# Altium footprint library 20.Optical.PcbLib: 40 footprints (part 1 of 3)
Each footprint in its own frame and in the unit in brackets; x right, y up, seen from the top. Pads: shape width x height; smd on the part's side, far side on the other; paste and mask are expansions set on the pad; w line width, h text height; cw(c..) or ccw(c..) is an arc to the next point about the centre after c.
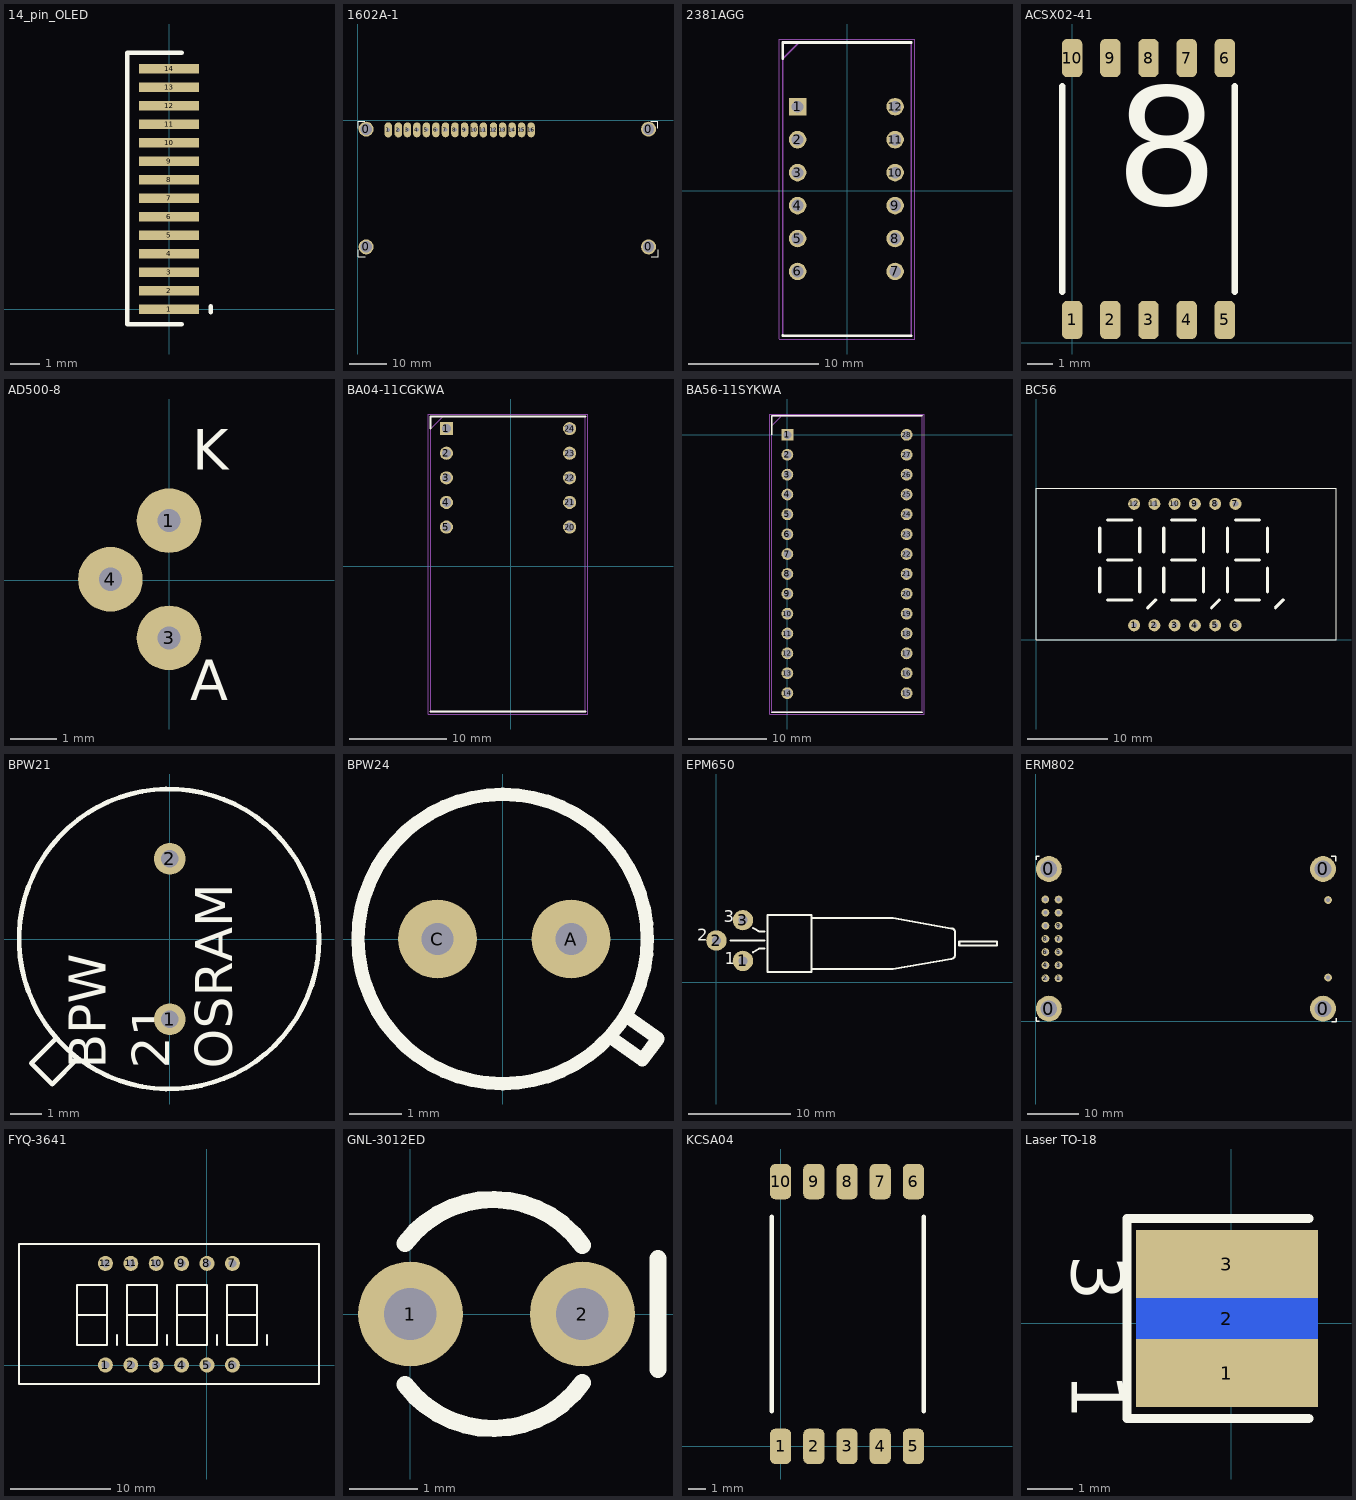
[diagram p0: the footprints below, top view; thin cyan lines are the x and y axes]

## 14_pin_OLED [mm]
pads (14):
  rect 2x0.32 smd: 1(0,0) 2(0,0.62) 3(0,1.24) 4(0,1.86) 5(0,2.48) 6(0,3.1) 7(0,3.72) 8(0,4.34) 9(0,4.96) 10(0,5.58) 11(0,6.2) 12(0,6.82) 13(0,7.44) 14(0,8.06)
Top Overlay:
  lines w0.15: 0.424,-0.5 -1.397,-0.5 -1.397,8.6 0.424,8.6 ; 1.394,-0.1 1.394,0.1

## 1602A-1 [mm]
pads (20):
  round 4 hole 3: 0(2.3,-33.8) 0(2.3,-2.4) 0(77.7,-33.8) 0(77.7,-2.4)
  oval 2x4 hole 1: 1(8.2,-2.6) 2(10.9,-2.6) 3(13.32,-2.58) 4(15.86,-2.58) 5(18.4,-2.58) 6(20.94,-2.58) 7(23.48,-2.58) 8(26.02,-2.58) 9(28.56,-2.58) 10(31.1,-2.58) 11(33.6,-2.6) 12(36.3,-2.6) 13(38.72,-2.58) 14(41.26,-2.58) 15(43.8,-2.58) 16(46.34,-2.58)
Top Overlay:
  lines w0.254: 0.127,-2.083 0.127,-0.229 1.981,-0.229 ; 0.203,-34.646 0.203,-36.5 2.057,-36.5 ; 78.334,-0.33 80.188,-0.33 80.188,-2.184 ; 78.359,-36.474 80.213,-36.474 80.213,-34.62
3D body "User Library-LCD1602.step": height 15.05, standoff 3, extent 0.075,-36.125 80.075,-0.125
3D body "User Library-M3x0_5xL Phillips Panhead Screw.step": height 7.38, standoff 1, extent -0.225,-36.475 5.375,-30.875
3D body "User Library-M3x0_5xL Phillips Panhead Screw.step": height 7.38, standoff 1, extent 0.175,-5.175 5.775,0.425
3D body "User Library-M3x0_5xL Phillips Panhead Screw.step": height 7.38, standoff 1, extent 75.05,-4.875 80.65,0.725
3D body "User Library-M3x0_5xL Phillips Panhead Screw.step": height 7.38, standoff 1, extent 74.725,-35.65 80.325,-30.05

## 2381AGG [mm]
pads (12):
  rect 1.35x1.35 hole 0.9: 1(-3.81,6.477)
  round 1.35 hole 0.9: 2(-3.81,3.937) 3(-3.81,1.397) 4(-3.81,-1.143) 5(-3.81,-3.683) 6(-3.81,-6.223) 7(3.71,-6.223) 8(3.71,-3.683) 9(3.71,-1.143) 10(3.71,1.397) 11(3.71,3.937) 12(3.71,6.477)
Top Overlay:
  lines w0.2: -4.953,-11.161 4.953,-11.176 ; -4.953,10.175 -4.953,11.43 4.953,11.43
Mechanical 13:
  lines w0.1: -4.953,-11.176 4.953,-11.176 4.953,11.43 -4.953,11.43 -4.953,-11.161 ; -4.953,10.16 -3.683,11.43
Mechanical 15:
  lines w0.05: -5.207,-11.43 5.207,-11.43 5.207,11.684 ; -5.207,-11.415 -5.207,11.699 5.207,11.699
3D body "2381AGG.step": height 6.15, standoff -4.16, extent -5,-11.123 5,11.377

## ACSX02-41 [mm]
pads (10):
  rrect50% 0.8x1.5 smd: 1(0,0.9) 2(1.5,0.9) 3(3,0.9) 4(4.5,0.9) 5(6,0.9) 6(6,11.2) 7(4.5,11.2) 8(3,11.2) 9(1.5,11.2) 10(0,11.2)
Top Overlay:
  lines w0.254: -0.4,2 -0.4,10.1 ; 6.4,2 6.4,10.1
  text "8" at 1.7,3.9 h8
3D body "ACSX02-41.STEP": height 3.1, standoff 0.05, extent -0.45,1 6.45,11

## AD500-8 [mm]
pads (3):
  round 1.4 hole 0.5: 1(0,1.295) 3(0,-1.245) 4(-1.27,0.025)
Top Overlay:
  text "K" at 0.508,2.108 h1.5
  text "A" at 0.457,-2.896 h1.5
Bottom Overlay:
  circle w0.254: c0,0.025 r2.7
  lines w0.254: -2.176,1.724 -2.676,2.224 -2.276,2.624 -1.776,2.124
3D body "User Library-TO-52.step": height 6.7, standoff -10.08, extent -4.129,-4.781 4.806,4.155

## BA04-11CGKWA [mm]
pads (10):
  rect 1.35x1.35 hole 0.9: 1(-6.63,14.224)
  round 1.35 hole 0.9: 2(-6.63,11.684) 3(-6.63,9.144) 4(-6.63,6.604) 5(-6.63,4.064) 20(6.07,4.064) 21(6.07,6.604) 22(6.07,9.144) 23(6.07,11.684) 24(6.07,14.224)
Top Overlay:
  lines w0.2: -8.255,-14.971 7.695,-14.971 ; -8.255,14.224 -8.255,15.479 7.695,15.479
Mechanical 13:
  lines w0.1: -8.255,14.209 -6.985,15.479 ; -8.255,-14.971 -8.255,15.479 7.695,15.479 7.695,-14.971 -8.255,-14.971
Mechanical 15:
  lines w0.05: -8.505,-15.221 -8.505,15.729 7.945,15.729 7.945,-15.221 -8.505,-15.221

## BA56-11SYKWA [mm]
pads (28):
  rect 1.5x1.5 hole 1: 1(0,0)
  round 1.5 hole 1: 2(0,-2.54) 3(0,-5.08) 4(0,-7.62) 5(0,-10.16) 6(0,-12.7) 7(0,-15.24) 8(0,-17.78) 9(0,-20.32) 10(0,-22.86) 11(0,-25.4) 12(0,-27.94) 13(0,-30.48) 14(0,-33.02) 15(15.24,-33.02) 16(15.24,-30.48) 17(15.24,-27.94) 18(15.24,-25.4) 19(15.24,-22.86) 20(15.24,-20.32) 21(15.24,-17.78) 22(15.24,-15.24) 23(15.24,-12.7) 24(15.24,-10.16) 25(15.24,-7.62) 26(15.24,-5.08) 27(15.24,-2.54) 28(15.24,0)
Top Overlay:
  lines w0.2: -2.005,-35.435 17.245,-35.435 ; -2.005,0 -2.005,2.415 17.245,2.415
Mechanical 13:
  lines w0.1: -2.005,-35.435 -2.005,2.415 17.245,2.415 17.245,-35.435 ; -2.005,1.145 -0.735,2.415
  lines w0.2: -2.005,-35.435 17.245,-35.435
Mechanical 15:
  lines w0.05: -2.255,-35.685 17.495,-35.685 17.495,2.665 -2.255,2.665 -2.255,-35.685
3D body "Индикатор-жёлтый.STEP": height 8.2, standoff -3.9, extent -1.875,-35.3 17.125,2.3

## BC56 [mm]
pads (12):
  round 1.5 hole 0.7: 1(12.3,1.8) 2(14.84,1.8) 3(17.38,1.8) 4(19.92,1.8) 5(22.46,1.8) 6(25,1.8) 7(25,17.04) 8(22.46,17.04) 9(19.92,17.04) 10(17.38,17.04) 11(14.84,17.04) 12(12.3,17.04)
Top Overlay:
  lines w0.15: 0,0 0,19 37.6,19 37.6,0 0,0
  lines w0.4: 8,6 8,9 ; 8,11 8,14 ; 9,5 12,5 ; 9,10 12,10 ; 9,15 12,15 ; 13,6 13,9 ; 13,11 13,14 ; 14,4 15,5 ; 16,6 16,9 ; 16,11 16,14 ; 17,5 20,5 ; 17,10 20,10 ; 17,15 20,15 ; 21,6 21,9 ; 21,11 21,14 ; 22,4 23,5 ; 24,6 24,9 ; 24,11 24,14 ; 25,5 28,5 ; 25,10 28,10 ; 25,15 28,15 ; 29,6 29,9 ; 29,11 29,14 ; 30,4 31,5
3D body "User Library-5631_Green_jam.step": height 11.1, standoff -2.5, extent -0.131,0 37.469,19

## BPW21 [mm]
pads (2):
  round 1 hole 0.55: 1(0,-2.54) 2(0,2.54)
Top Overlay:
  circle w0.15: c-0.025,0 r4.75
  lines w0.15: -3.625,-3.175 -4.387,-3.938 -3.725,-4.6 -2.925,-3.8 -3.075,-3.65
  text "BPW / 21 / OSRAM" at 2.375,-4.103 h2
3D body "User Library-BPW21 (1).step": height 4.95, standoff -13.5, extent -4.75,-4.775 4.75,4.725

## BPW24 [mm]
pads (2):
  round 1.5 hole 0.6: A(1.3,0) C(-1.24,0)
Top Overlay:
  circle w0.254: c0,0 r2.751
  lines w0.254: 2.1,-1.9 2.653,-2.295 2.953,-1.895 2.4,-1.5

## EPM650 [mm]
pads (3):
  round 2 hole 0.9: 1(2.6,2.1) 2(0,4.1) 3(2.6,6.1)
Top Overlay:
  lines w0.2: 1.4,4.1 4.7,4.1 ; 3.572,2.951 4.2,3.3 4.7,3.3 ; 3.572,5.349 4.2,5 4.7,5 ; 5,1 9.3,1 9.3,6.6 5,6.6 5,1 ; 9.3,1.3 9.3,6.3 17.3,6.3 23,5.3 cw(c23,4.9) 23.4,4.9 23.4,2.7 cw(c23,2.7) 23,2.3 17.3,1.3 9.3,1.3 ; 23.8,3.6 23.8,4 27.5,4 27.5,3.6 23.8,3.6
  text "3" at 0.7,5.5 h2
  text "2" at -1.9,3.7 h2
  text "1" at 0.8,1.4 h2
3D body "User Library-EPM650.step": height 6.78, standoff -3, extent -0.3,0.612 27.425,6.9

## ERM802 [mm]
pads (20):
  round 5 hole 3.2: 0(2.508,2.428) 0(2.508,29.428) 0(55.508,2.428) 0(55.508,29.428)
  round 1.5 hole 0.8: 1(4.368,8.282) 2(1.828,8.282) 3(4.368,10.822) 4(1.828,10.822) 5(4.368,13.362) 6(1.821,13.362) 7(4.368,15.902) 8(1.828,15.902) 9(4.368,18.442) 10(1.828,18.442) 11(4.368,20.982) 12(1.828,20.982) 13(4.368,23.522) 14(1.814,23.535) 15(56.488,23.428) 16(56.488,8.428)
Top Overlay:
  lines w0.254: 0.011,0.762 0.011,0.028 0.66,0.028 ; 0.035,31.191 0.035,31.899 0.66,31.899 ; 57.15,31.898 57.996,31.898 57.996,30.963 ; 57.226,-0.147 58.021,-0.147 58.021,0.61
3D body "User Library-M3x0_5xL Phillips Panhead Screw.step": height 13.88, standoff 7.5, extent -0.464,-0.366 5.136,5.234
3D body "User Library-M3x0_5xL Phillips Panhead Screw.step": height 13.88, standoff 7.5, extent 52.616,26.558 58.216,32.158
3D body "User Library-M3x0_5xL Phillips Panhead Screw.step": height 13.88, standoff 7.5, extent 52.616,-0.366 58.216,5.234
3D body "User Library-M3x0_5xL Phillips Panhead Screw.step": height 13.88, standoff 7.5, extent -0.47,26.558 5.13,32.158
3D body "User Library-Hexagonal Threaded Standoffs": height -0.5, standoff -10.5, extent 52.443,0.448 58.216,5.448
3D body "User Library-Hexagonal Threaded Standoffs": height -0.5, standoff -10.5, extent -0.389,26.824 5.384,31.824
3D body "User Library-Hexagonal Threaded Standoffs": height -0.5, standoff -10.5, extent 52.697,27.158 58.47,32.158
3D body "User Library-Hexagonal Threaded Standoffs": height -0.5, standoff -10.5, extent -0.297,-0.059 5.477,4.941
3D body "User Library-lcd_8x2.STEP": height 18.2, standoff 9.99, extent 0.008,-0.072 58.008,31.928

## FYQ-3641 [mm]
pads (12):
  round 1.5 hole 0.8: 1(-10.16,0) 2(-7.62,0) 3(-5.08,0) 4(-2.54,0) 5(0,0) 6(2.54,0) 7(2.54,10.16) 8(0,10.16) 9(-2.54,10.16) 10(-5.08,10.16) 11(-7.62,10.16) 12(-10.16,10.16)
Top Overlay:
  lines w0.2: -13,5 -10,5 ; -9,2 -9,3 ; -8,5 -5,5 ; -4,2 -4,3 ; -3,5 0,5 ; 1,2 1,3 ; 2,5 5,5 ; 6,2 6,3 ; -18.8,-1.9 -18.8,12.1 11.2,12.1 11.2,-1.9 -18.8,-1.9 ; -13,2 -10,2 -10,8 -13,8 -13,2 ; -8,2 -8,8 -5,8 -5,2 -8,2 ; -3,2 -3,8 0,8 0,2 -3,2 ; 2,2 2,8 5,8 5,2 2,2
3D body "User Library-3641_Green_jam.step": height 10.1, standoff -2.5, extent -18.8,-1.9 11.2,12.1

## GNL-3012ED [mil]
pads (2):
  round 60 hole 30: 1(0,0) 2(98.43,0)
Top Overlay:
  lines w10: -3.09,-40.36 ccw(c47.3,-2.56) 98.43,-39.37 ; -3.09,40.36 cw(c47.3,2.56) 98.43,39.37 ; 141.73,-31.5 141.73,31.5
3D body "User Library-LED RED 3mm.step": height 366.14, standoff -39.37, extent -23.62,-74.7 114.18,74.71

## KCSA04 [mm]
pads (10):
  rrect50% 1.2x2 smd: 1(0,0) 2(1.88,0) 3(3.76,0) 4(5.64,0) 5(7.52,0) 6(7.52,15) 7(5.64,15) 8(3.76,15) 9(1.88,15) 10(0,15)
Top Overlay:
  lines w0.254: -0.5,2 -0.5,13 ; 8.1,2 8.1,13
Mechanical 13:
  text "=Value" at 2.287,7.241 h1.52
3D body: height 1, standoff 0, extent -0.69,-0.04 8.31,15.026
3D body: height 3.76, standoff 0, extent 6.5,2.403 7.5,3.597
3D body: height 3.76, standoff 0, extent 2.501,2.942 5.501,3.942
3D body: height 3.76, standoff 0, extent 5.512,4.035 6.512,7.035
3D body: height 3.76, standoff 0, extent 1.46,3.977 2.46,6.977
3D body: height 3.76, standoff 0, extent 2.456,7.09 5.456,8.09
3D body: height 3.76, standoff 0, extent 5.469,8.184 6.469,11.184
3D body: height 3.76, standoff 0, extent 2.484,11.338 5.484,12.338
3D body: height 3.76, standoff 0, extent 1.469,8.184 2.469,11.184
3D body: height 3.75, standoff 0, extent -0.697,0.94 8.303,13.94

## Laser TO-18 [mm]
pads (3):
  rect 4x1.5 smd: 1(-0.1,-1.1) 3(-0.1,1.3)
  rect 4x1.5 smd far side: 2(-0.1,0.1)
Top Overlay:
  lines w0.2: 1.7,-2.1 -2.3,-2.1 -2.3,2.3 1.7,2.3
  text "1" at -3.9,-1.1 h2
  text "3" at -3.9,1.5 h2
Bottom Overlay:
  lines w0.2: 1.7,-0.8 -2.3,-0.8 -2.3,1 1.7,1
  text "2" at -3.9,-0.4 h2
3D body "ld_to18_5_6mm_SONY SLD3232VF.STEP": height 3.1, standoff -2.45, extent -2.1,-2.8 7.9,2.75